# Altium footprint library 3D_MIG_Controller.PCBLIB: 560 footprints (part 13 of 35)
Each footprint in its own frame and in the unit in brackets; x right, y up, seen from the top. Pads: shape width x height; smd on the part's side, far side on the other; paste and mask are expansions set on the pad; w line width, h text height; cw(c..) or ccw(c..) is an arc to the next point about the centre after c.
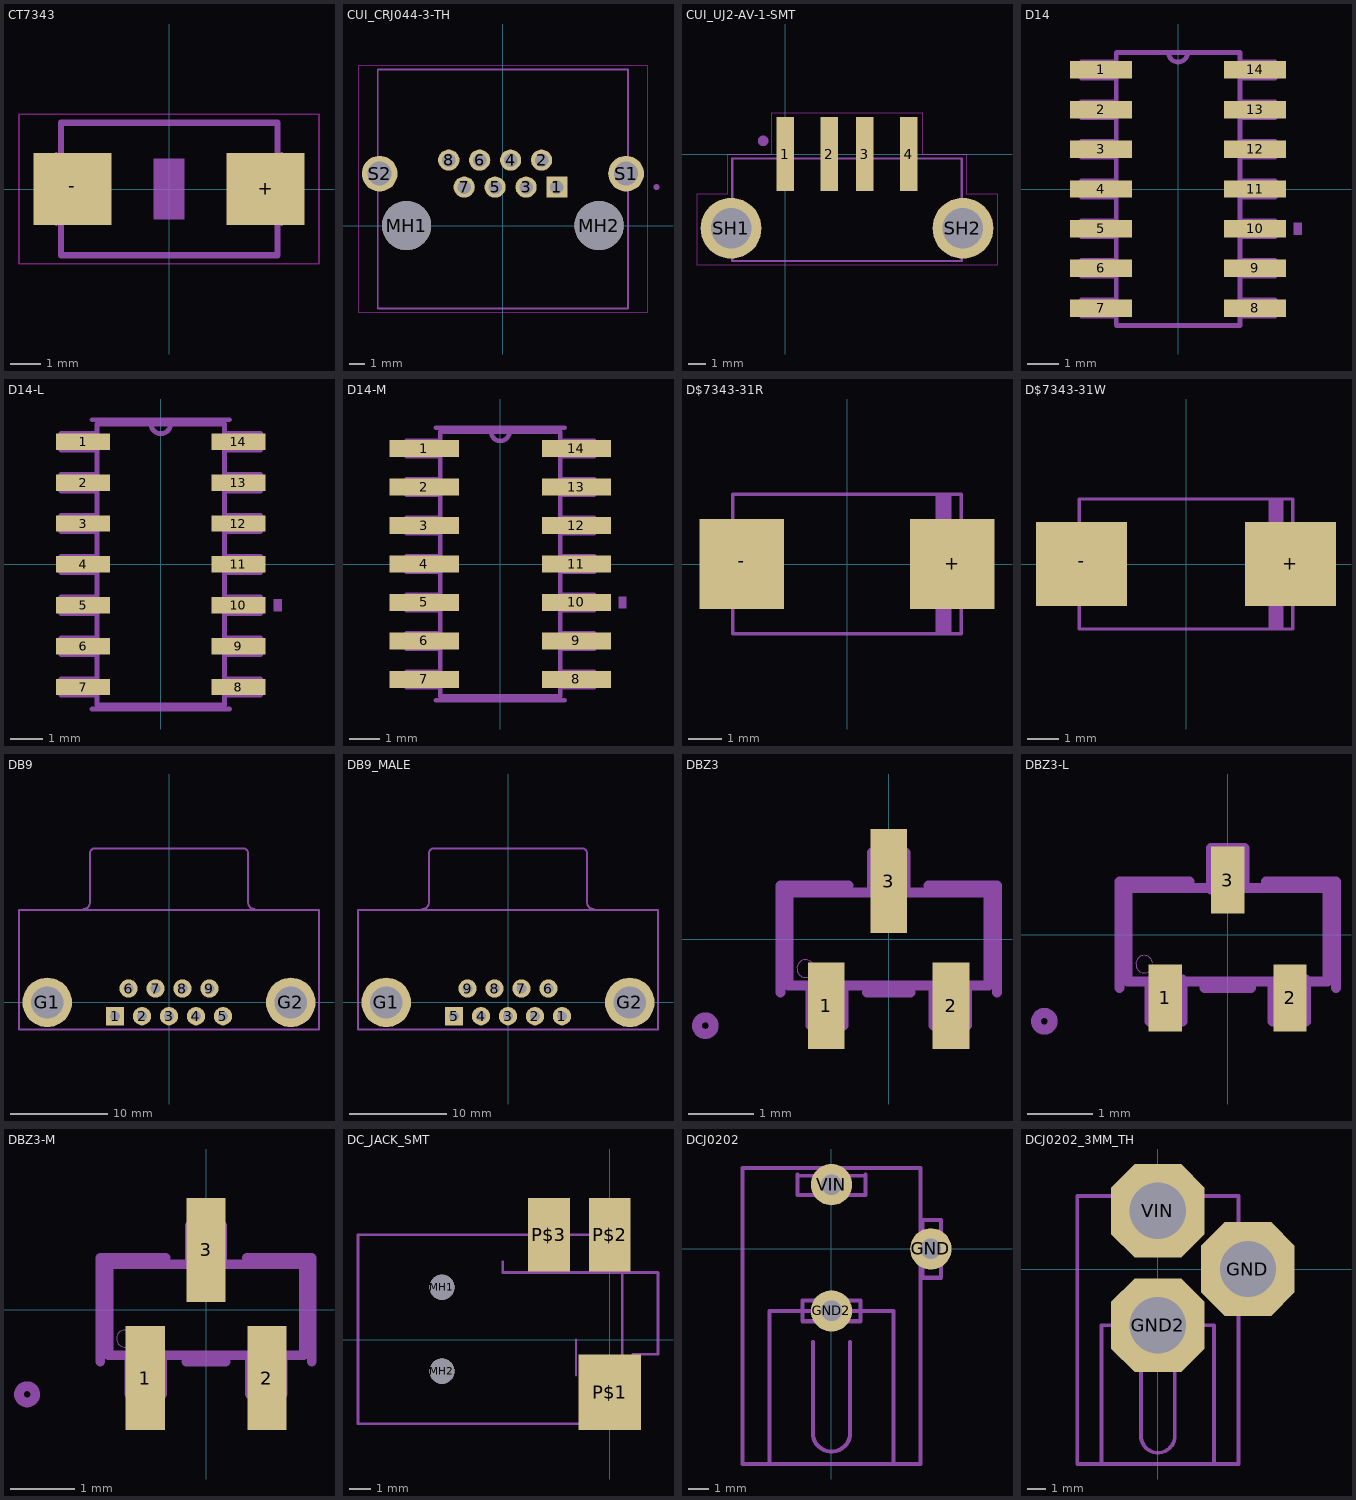
[diagram p12: the footprints below, top view; thin cyan lines are the x and y axes]

## CT7343 [mil]
pads (2):
  rect 102.36x94.49 smd: +(125.98,0) -(-125.98,0)
Top keep-out:
  lines w2: -195.79,-97.76 195.79,-97.76 195.79,97.76 -195.79,97.76 -195.79,-97.76
tDocu:
  lines w6: -147.01,-45 -147.01,45 ; 147.01,-45 147.01,45
  lines w8: -141.02,-86.42 -141.02,86.42 ; 80.32,0 121.65,0 ; 100.39,-20.47 100.39,20.47 ; 141.42,-86.42 141.42,86.42
tPlace:
  lines w8: -141.02,-63.58 -141.02,-86.42 141.42,-86.42 141.42,-63.58 ; -141.02,63.58 -141.02,86.42 141.42,86.42 141.42,63.58
tGlue:
  region: -19.69,-39.37 -19.69,39.37 19.69,39.37 19.69,-39.37

## CUI_CRJ044-3-TH [mm]
pads (12):
  rect 1.398x1.398 / inner round 1.292 / far side rect 1.398x1.398 hole 0.89: 1(3.57,2.54)
  round 1.398 hole 0.89: 2(2.55,4.32) 3(1.53,2.54) 4(0.51,4.32) 5(-0.51,2.54) 6(-1.53,4.32) 7(-2.55,2.54) 8(-3.57,4.32)
  round 3.25 hole 3.25 unplated: MH1(-6.35,0) MH2(6.35,0)
  round 2.355 hole 1.57: S1(8.13,3.43) S2(-8.13,3.43)
Top keep-out:
  lines w0.05: -9.558,-5.71 -9.558,10.54 9.558,10.54 9.558,-5.71 -9.558,-5.71
tDocu:
  circle w0.2: c10.135,2.54 r0.1
  lines w0.127: -8.255,-5.46 8.255,-5.46 8.255,10.29 -8.255,10.29 -8.255,-5.46
tPlace:
  circle w0.2: c10.135,2.54 r0.1
  lines w0.127: -8.255,-1.945 -8.255,-5.46 8.255,-5.46 8.255,-1.945 ; -8.255,4.928 -8.255,10.29 8.255,10.29 8.255,4.928

## CUI_UJ2-AV-1-SMT [mm]
pads (6):
  rect 1x4.2 smd: 1(0,0) 2(2.5,0) 3(4.5,0) 4(7,0)
  round 3.45 hole 2.3: SH1(-3.07,-4.2) SH2(10.07,-4.2)
Top keep-out:
  lines w0.05: -5,-6.3 12,-6.3 12,-2.25 10.25,-2.25 10.25,0 7.75,0 7.75,2.35 -0.75,2.35 -0.75,0 -3.25,0 -3.25,-2.25 -5,-2.25 -5,-6.3
tDocu:
  circle w0.3: c0,0.75 r0.15
  lines w0.127: -3,-6.05 10,-6.05 10,-0.25 -3,-0.25 -3,-6.05
tPlace:
  circle w0.3: c-1.25,0.75 r0.15
  lines w0.127: -3,-6.05 10,-6.05 ; -3,-2.35 -3,-0.25 -0.65,-0.25 ; 7.65,-0.25 10,-0.25 10,-2.35

## D14 [mil]
pads (14):
  rect 78x22 smd: 1(-97,150) 2(-97,100) 3(-97,50) 4(-97,0) 5(-97,-50) 6(-97,-100) 7(-97,-150) 8(97,-150) 9(97,-100) 10(97,-50) 11(97,0) 12(97,50) 13(97,100) 14(97,150)
tDocu:
  lines w6: -12,172 12,172 ; -12,172 -78,172 -78,-172 78,-172 78,172 12,172 ; -12,172 ccw(c0,172) 12,172 ; -122,-160 -122,-140 -78,-140 -78,-160 -122,-160 ; -122,-110 -122,-90 -78,-90 -78,-110 -122,-110 ; -122,-60 -122,-40 -78,-40 -78,-60 -122,-60 ; -122,-10 -122,10 -78,10 -78,-10 -122,-10 ; -122,40 -122,60 -78,60 -78,40 -122,40 ; -122,90 -122,110 -78,110 -78,90 -122,90 ; -122,140 -122,160 -78,160 -78,140 -122,140 ; 78,-160 78,-140 122,-140 122,-160 78,-160 ; 78,-110 78,-90 122,-90 122,-110 78,-110 ; 78,-60 78,-40 122,-40 122,-60 78,-60 ; 78,-10 78,10 122,10 122,-10 78,-10 ; 78,40 78,60 122,60 122,40 78,40 ; 78,90 78,110 122,110 122,90 78,90 ; 78,140 78,160 122,160 122,140 78,140
  text "*" at -130,167 h77.5
tPlace:
  region: 156,-42.5 156,-57.5 146,-57.5 146,-42.5
  lines w6: -51,-172 51,-172 ; -51,172 -12,172 ; 51,172 12,172 ; -12,172 12,172 ; -12,172 ccw(c0,172) 12,172
  text "*" at -130,167 h77.5

## D14-L [mil]
pads (14):
  rect 66x20 smd: 1(-95,150) 2(-95,100) 3(-95,50) 4(-95,0) 5(-95,-50) 6(-95,-100) 7(-95,-150) 8(95,-150) 9(95,-100) 10(95,-50) 11(95,0) 12(95,50) 13(95,100) 14(95,150)
tDocu:
  lines w6: -12,172 12,172 ; -12,172 -78,172 -78,-172 78,-172 78,172 12,172 ; -12,172 ccw(c0,172) 12,172 ; -122,-160 -122,-140 -78,-140 -78,-160 -122,-160 ; -122,-110 -122,-90 -78,-90 -78,-110 -122,-110 ; -122,-60 -122,-40 -78,-40 -78,-60 -122,-60 ; -122,-10 -122,10 -78,10 -78,-10 -122,-10 ; -122,40 -122,60 -78,60 -78,40 -122,40 ; -122,90 -122,110 -79,110 -78,90 -122,90 ; -122,140 -122,160 -79,160 -78,140 -122,140 ; 78,-140 79,-160 122,-160 122,-140 78,-140 ; 78,-110 78,-90 122,-90 122,-110 78,-110 ; 78,-60 78,-40 122,-40 122,-60 78,-60 ; 78,-10 78,10 122,10 122,-10 78,-10 ; 78,40 78,60 122,60 122,40 78,40 ; 78,90 78,110 122,110 122,90 78,90 ; 78,140 78,160 122,160 122,140 78,140
  text "*" at -86,119 h77.5
tPlace:
  region: 148,-42.5 148,-57.5 138,-57.5 138,-42.5
  lines w6: -84,-177 84,-177 ; -84,177 84,177
  text "*" at -128,165 h77.5

## D14-M [mil]
pads (14):
  rect 90x22 smd: 1(-99,150) 2(-99,100) 3(-99,50) 4(-99,0) 5(-99,-50) 6(-99,-100) 7(-99,-150) 8(99,-150) 9(99,-100) 10(99,-50) 11(99,0) 12(99,50) 13(99,100) 14(99,150)
tDocu:
  lines w6: -12,172 12,172 ; -12,172 -78,172 -78,-172 78,-172 78,172 12,172 ; -12,172 ccw(c0,172) 12,172 ; -122,-160 -122,-140 -78,-140 -78,-160 -122,-160 ; -122,-110 -122,-90 -78,-90 -78,-110 -122,-110 ; -122,-60 -122,-40 -78,-40 -78,-60 -122,-60 ; -122,-10 -122,10 -78,10 -78,-10 -122,-10 ; -122,40 -122,60 -78,60 -78,40 -122,40 ; -122,90 -122,110 -79,110 -78,90 -122,90 ; -122,140 -122,160 -79,160 -78,140 -122,140 ; 78,-140 79,-160 122,-160 122,-140 78,-140 ; 78,-110 78,-90 122,-90 122,-110 78,-110 ; 78,-60 78,-40 122,-40 122,-60 78,-60 ; 78,-10 78,10 122,10 122,-10 78,-10 ; 78,40 78,60 122,60 122,40 78,40 ; 78,90 78,110 122,110 122,90 78,90 ; 78,140 78,160 122,160 122,140 78,140
  text "*" at -86,119 h77.5
tPlace:
  region: 164,-42.5 164,-57.5 154,-57.5 154,-42.5
  lines w6: -84,-177 84,-177 ; -84,177 84,177
  text "*" at -132,167 h77.5

## D$7343-31R [mil]
pads (2):
  rect 100.39x106.3 smd: +(125,0) -(-125,0)
tDocu:
  region: -143.7,-47.24 -143.7,47.24 -137.8,47.24 -137.8,-47.24
  region: 137.8,-47.24 137.8,47.24 143.7,47.24 143.7,-47.24
  region: 105.32,-83.66 105.32,83.66 124.02,83.66 124.02,-83.66
  lines w4: -135.83,-82.68 135.83,-82.68 135.83,82.68 -135.83,82.68 -135.83,-82.68

## D$7343-31W [mil]
pads (2):
  rect 116.14x106.3 smd: +(132.87,0) -(-132.87,0)
tDocu:
  region: -143.7,-47.24 -143.7,47.24 -137.8,47.24 -137.8,-47.24
  region: 137.8,-47.24 137.8,47.24 143.7,47.24 143.7,-47.24
  region: 105.32,-83.66 105.32,83.66 124.02,83.66 124.02,-83.66
  lines w4: -135.83,-82.68 135.83,-82.68 135.83,82.68 -135.83,82.68 -135.83,-82.68

## DB9 [mil]
pads (11):
  rect 74x74 / inner round 68.37 / far side rect 74x74 hole 39.37: 1(-218.11,-55.91)
  round 74 hole 39.37: 2(-109.06,-55.91) 3(0,-55.91) 4(109.06,-55.91) 5(218.11,-55.91) 6(-163.39,55.91) 7(-54.33,55.91) 8(54.33,55.91) 9(163.39,55.91)
  round 200 hole 129.88: G1(-492.13,0) G2(492.13,0)
tDocu:
  lines w8: -606.3,100.1 -606.3,374.02 606.3,374.02 606.3,100 ; -345,377.32 ccw(c-345,402.32) -320,402.32 -320,602.32 cw(c-300,602.32) -300,622.32 300,622.32 cw(c300,602.32) 320,602.32 320,402.32 ccw(c345,402.32) 345,377.32
tPlace:
  lines w8: -606.3,100 -606.3,-110.24 606.3,-110.24 606.3,100

## DB9_MALE [mil]
pads (11):
  round 74 hole 39.37: 1(218.11,-55.91) 2(109.06,-55.91) 3(0,-55.91) 4(-109.06,-55.91) 6(163.39,55.91) 7(54.33,55.91) 8(-54.33,55.91) 9(-163.39,55.91)
  rect 74x74 / inner round 68.37 / far side rect 74x74 hole 39.37: 5(-218.11,-55.91)
  round 200 hole 129.88: G1(-492.13,0) G2(492.13,0)
tDocu:
  lines w8: -606.3,100.1 -606.3,374.02 606.3,374.02 606.3,100 ; -345,377.32 ccw(c-345,402.32) -320,402.32 -320,602.32 cw(c-300,602.32) -300,622.32 300,622.32 cw(c300,602.32) 320,602.32 320,402.32 ccw(c345,402.32) 345,377.32
tPlace:
  lines w8: -606.3,100 -606.3,-110.24 606.3,-110.24 606.3,100

## DBZ3 [mil]
pads (3):
  rect 22x52 smd: 1(-37.4,-40) 2(37.4,-40)
  rect 22x62.5 smd: 3(0,34.75)
tDocu:
  lines w0: -45,-18 cw(c-50,-18) -55,-18 cw(c-50,-17.5) -45,-17
  lines w6: -60,-28 60,-28 60,28 -60,28 -60,-28 ; -47,-52 -47,-28 -27,-28 -27,-52 -47,-52 ; -10,28 10,28 10,52 -10,52 -10,28 ; 27,-52 27,-28 47,-28 47,-52 27,-52
tPlace:
  lines w6: -65,-32 -65,32 -24,32 ; -13,-32 13,-32 ; 24,32 65,32 65,-32 ; -115,-52 ccw(c-110,-52) -105,-52 ccw(c-110,-52) -115,-52

## DBZ3-L [mil]
pads (3):
  rect 20x40 smd: 1(-37.4,-38) 2(37.4,-38) 3(0,32.75)
tDocu:
  lines w0: -45,-18 cw(c-50,-18) -55,-18 cw(c-50,-17.5) -45,-17
  lines w6: -60,-28 60,-28 60,28 -60,28 -60,-28 ; -47,-52 -47,-28 -27,-27 -27,-52 -47,-52 ; -10,27 10,28 10,52 -10,52 -10,27 ; 27,-52 27,-28 47,-27 47,-52 27,-52
tPlace:
  lines w6: -65,-32 -65,32 -23,32 ; -14,-32 14,-32 ; 23,32 65,32 65,-32 ; -115,-52 ccw(c-110,-52) -105,-52 ccw(c-110,-52) -115,-52

## DBZ3-M [mil]
pads (3):
  rect 24x64 smd: 1(-37.4,-42) 2(37.4,-42) 3(0,36.75)
tDocu:
  lines w0: -45,-18 cw(c-50,-18) -55,-18 cw(c-50,-17.5) -45,-17
  lines w6: -60,-28 60,-28 60,28 -60,28 -60,-28 ; -47,-52 -47,-28 -27,-27 -27,-52 -47,-52 ; -10,27 10,28 10,52 -10,52 -10,27 ; 27,-52 27,-28 47,-27 47,-52 27,-52
tPlace:
  lines w6: -65,-32 -65,32 -25,32 ; -12,-32 12,-32 ; 25,32 65,32 65,-32 ; -115,-52 ccw(c-110,-52) -105,-52 ccw(c-110,-52) -115,-52

## DC_JACK_SMT [mm]
pads (5):
  round 1.2 hole 1.2 unplated: MH1(-8,2.5) MH2(-8,-1.5)
  rect 3x3.6 smd: P$1(0,-2.5)
  rect 2x3.5 smd: P$2(0,5) P$3(-2.9,5)
tDocu:
  lines w0.127: -12,-4 -12,5 0.6,5 0.6,-4 -12,-4
  text "1" at -2,-4 h1.97
  text "3" at -0.8,1.2 h1.97
  text "2" at -3.9,1.3 h1.57
tPlace:
  lines w0.1: -1.6,-1.7 -1.6,0
  lines w0.127: -5.1,3.7 -5.1,3.2 2.3,3.2 2.3,-0.7 1.1,-0.7

## DCJ0202 [mm]
pads (3):
  round 2 hole 1: GND(4.8,0) GND2(0,-3) VIN(0,3.1)
Milling:
  lines w0: -1.65,3.6 1.65,3.6 ; -1.4,-3.5 1.4,-3.5 1.4,-2.5 -1.4,-2.5 -1.4,-3.5 ; 4.3,-1.4 4.3,1.4 5.3,1.4 5.3,-1.4 4.3,-1.4
  lines w0.127: -1.6,3.5 1.6,3.5
  lines w0.2: -1.65,3.6 -1.65,2.6 1.65,2.6 1.65,3.6 ; -1.4,-3.5 1.4,-3.5 1.4,-2.5 -1.4,-2.5 -1.4,-3.5 ; 4.4,-1.4 5.3,-1.4 5.3,1.4 4.4,1.4 4.4,-1.4
tDocu:
  lines w0.203: -4.3,3.9 4.3,3.9 4.3,-10.4 ; -3,-10.275 -3,-3 3,-3 3,-10.3 ; -0.9,-4.5 -0.9,-9 ccw(c0,-8.894) 0.9,-9 0.9,-4.5
tPlace:
  lines w0.203: -2.7,3.9 -4.3,3.9 -4.3,-10.4 4.3,-10.4 4.3,-2.45 ; 2.7,3.9 4.3,3.9 4.3,2.3

## DCJ0202_3MM_TH [mm]
pads (3):
  oct 5x5 / inner round 4.619 / far side oct 5x5 hole 3: GND(4.8,0) GND2(0,-3) VIN(0,3.1)
tDocu:
  lines w0.203: -4.3,3.9 4.3,3.9 4.3,-10.4 ; -3,-10.275 -3,-3 3,-3 3,-10.3 ; -0.9,-4.5 -0.9,-9 ccw(c0,-8.894) 0.9,-9 0.9,-4.5
tPlace:
  lines w0.203: -2.7,3.9 -4.3,3.9 -4.3,-10.4 4.3,-10.4 4.3,-2.45 ; 2.7,3.9 4.3,3.9 4.3,2.3